# Altium schematic symbol library TI Amplifiers and Linear Special Function Amplifier.SchLib: 708 symbols (part 12 of 34) (continued)
## TAS5508CPAG
designator U?
8 Channel PWM Processor, 0 to 70 degC, 64-pin QFP (PAG64), Green (RoHS & no Sb/Br); Manufacturer: Texas Instruments; PartNumber: TAS5508CPAG; Audio Output Channels (PWM)(#): 8; Bass/Treble Tone Control: TRUE; Data Resolution: 16, 20, 24; Digital Supply (up to 5 V)(Max)(V): 3.6; Digital Supply (up to 5 V)(Min)(V): 3; Dynamic Range(dB): 102; Fs(Max)(kHz): 192; Fs(Min)(kHz): 32; Loudness Compensation: Yes; Serial Interface: I2S, R, L; DatasheetVersion: SLES257; PackageVersion: 4040282/C, 11/1996; PackageReference: PAG64; PackageDescription: 64-Pin Plastic Flat Pack, Body 10 x 10 mm, Pitch 0.50 mm; Supplier 1: Digi-Key; Supplier Part Number 1: 296-32725-ND; Supplier 2: Mouser; Supplier Part Number 2: 595-TAS5508CPAG; Class-D: TRUE; Digital Input: TRUE; Eco-Plan: Green (RoHS & no Sb/Br); Mute: Yes; Output: PWM; PWM Headphone Output: TRUE; SubFamily: PWM Processor; Volume Control: TRUE; Mounting Technology: Surface Mount; Code_JEDEC: MS-026; ComponentLink1Description: Manufacturer URL; ComponentLink1URL: http://www.ti.com/; ComponentLink2Description: Datasheet; ComponentLink2URL: http://www.ti.com/general/docs/lit/getliterature.tsp?genericPartNumber=TAS5508C&fileType=pdf; ComponentLink3Description: Package Specification; ComponentLink3URL: http://www.ti.com/lit/ml/mtqf006a/mtqf006a.pdf
footprint TI-PAG64_N (QFP, 64-Leads, Body 10x10mm, Pitch 0.5mm, IPC Medium Density)
footprint TI-PAG64_L (QFP, 64-Leads, Body 10x10mm, Pitch 0.5mm, IPC High Density)
footprint TI-PAG64_M (QFP, 64-Leads, Body 10x10mm, Pitch 0.5mm, IPC Low Density)
part A pins: 2 PLL_FLT_RET (in) "PLL external filter return", 3 PLL_FLTM "PLL negative input. Connected to PLL_FLT_RTN via an RC network", 4 PLL_FLTP "PLL positive input. Connected to PLL_FLT_RTN via an RC network", 10 VBGAP (out) "Band-gap voltage reference. A pinout of the internally regulated 1.2-V reference.Typically has a 1-nF low-ESR capacitor between VBGAP and AVSS_PLL. This terminal must not be used to power external devices.", 11 ~{RESET} (in) "System reset input, active-low. A system reset is generated by applying a logic low to this terminal. R\E\S\E\T\ is an asynchronous control signal that restores the TAS5508C to its default conditions, sets the valid output (See Datasheet)", 12 ~{HP_SEL} (in) "Headphone in/out selector. When a logic low is applied, the headphone is selected (speakers are off). When a logic high is applied, speakers are selected(headphone is off).", 13 ~{PDN} (in) "Power down, active-low. P\D\N\ powers down all logic and stops all clocks whenever a logic low is applied. The internal parameters are preserved through a power-down cycle, as long as R\E\S\E\T\ is not active. The duration (See Datasheet)", 14 ~{MUTE} (in) "Soft mute of outputs, active-low (muted signal = a logic low, normal operation =a logic high). The mute control provides a noiseless volume ramp to silence.Releasing mute provides a noiseless ramp to previous volume.", 18 OSC_CAP "Oscillator capacitor", 19 XTL_OUT "XTL_OUT and XTL_IN are the only LVCMOS terminals on the device. They provide a reference clock for the TAS5508C via use of an external fundamental-mode crystal. XTL_OUT is the 1.8-V output drive to the crystal. A 13.5-MHz (See Datasheet)", 20 XTL_IN "XTL_OUT and XTL_IN are the only LVCMOS terminals on the device. They provide a reference clock for the TAS5508C via use of an external fundamental-mode crystal. XTL_IN  is the 1.8-V output drive to the crystal. A 13.5-MHz (See Datasheet)", 21 RESERVED (power) "Connect to digital ground", 22 RESERVED (power) "Connect to digital ground", 23 RESERVED (power) "Connect to digital ground", 24 SDA (io) "I2C serial-control data-interface input/output", 25 SCL (io) "I2C serial-control clock input/output", 26 LRCLK (in) "Serial-audio data left/right clock (sampling-rate clock)", 27 SCLK (in) "Serial-audio data clock (shift clock) input", 28 SDIN4 (in) "Serial-audio data input 4 is one of the serial-data input ports. SDIN4 supports four discrete (stereo) data formats and is capable of inputting data at 64 Fs.", 29 SDIN3 (in) "Serial-audio data input 3 is one of the serial-data input ports. SDIN4 supports four discrete (stereo) data formats and is capable of inputting data at 64 Fs.", 30 SDIN2 (in) "Serial-audio data input 2 is one of the serial-data input ports. SDIN2 supports four discrete (stereo) data formats and is capable of inputting data at 64 Fs.", 31 SDIN1 (in) "Serial-audio data input 1 is one of the serial-data input ports. SDIN2 supports four discrete (stereo) data formats and is capable of inputting data at 64 Fs.", 32 PSVC (hiz) "Power-supply volume control PWM output", 37 ~{BKND_ERR} (in) "Active-low. A back-end error sequence is generated by applying logic low to this terminal. The B\K\N\D\_\E\R\R\ results in no change to any system parameters, with all H-bridge drive signals going to a hard-mute (M) state.", 39 VALID (out) "Output indicating validity of PWM outputs, active-high", 40 PWM_M_1 (out) "PWM 1 output (differential -)", 41 PWM_P_1 (out) "PWM 1 output (differential +)", 42 PWM_M_2 (out) "PWM 2 output (differential -)", 43 PWM_P_2 (out) "PWM 2 output (differential +)", 44 PWM_M_3 (out) "PWM 3 output (differential -)", 45 PWM_P_3 (out) "PWM 3 output (differential +)", 46 PWM_M_4 (out) "PWM 4 output (differential -)", 47 PWM_P_4 (out) "PWM 4 output (differential +)", 49 PWM_M_7 (out) "PWM 7 (lineout L) output (differential -)", 50 PWM_P_7 (out) "PWM 7 (lineout L) output (differential +)", 51 PWM_M_8 (out) "PWM 8 (lineout R) output (differential -)", 52 PWM_P_8 (out) "PWM 8 (lineout R) output (differential +)", 55 PWM_M_5 (out) "PWM 5 output (differential -)", 56 PWM_P_5 (out) "PWM 5 output (differential +)", 57 PWM_M_6 (out) "PWM 6 output (differential -)", 58 PWM_P_6 (out) "PWM 6 output (differential +)", 59 PWM_HPML (out) "PWM left-channel headphone (differential -)", 60 PWM_HPPL (out) "PWM left-channel headphone (differential +)", 61 PWM_HPMR (out) "PWM right-channel headphone (differential -)", 62 PWM_HPPR (out) "PWM right-channel headphone (differential +)", 63 MCLK (in) "MCLK is a 3.3-V master clock input. The input frequency of this clock can range from 4 MHz to 50 MHz.", 64 RESERVED (power) "Connect to digital ground"
part B pins: 1 VRA_PLL (power) "Voltage reference for 1.8-V PLL analog supply. A pinout of the internally regulated 1.8-V power used by PLL logic. A 0.1-uF low-ESR capacitor should be connected between this terminal and AVSS_PLL. This terminal must not be (See Datasheet)", 5 AVSS (power) "Analog ground", 6 AVSS (power) "Analog ground", 7 VRD_PLL (power) "Voltage reference for 1.8-V PLL digital supply. A pinout of the internally regulated 1.8-V power used by PLL logic. A 0.1-uF low-ESR capacitor should be connected between this terminal and AVSS_PLL. This terminal must not be (See Datasheet)", 8 AVSS_PLL (power) "Analog ground for PLL. This terminal should reference the same ground as terminal DVSS, but to achieve low PLL jitter, ground noise at this terminal must be minimized. The availability of the AVSS terminal allows a designer (See Datasheet)", 9 AVDD_PLL (power) "3.3-V analog power supply for PLL. This terminal can be connected to the same power source used to drive power terminal DVDD, but to achieve low PLL jitter, this terminal should be bypassed to AVSS_PLL with a 0.1-uF low-ESR (See Datasheet)", 15 DVDD (power) "3.3-V digital power supply", 16 DVSS (power) "Digital ground", 17 VR_DPLL (power) "Voltage reference for 1.8-V digital PLL supply. A pinout of the internally regulated 1.8-V power used by digital PLL logic. A 0.1-uF low-ESR capacitor should be connected between this terminal and DVSS_CORE. This terminal (See Datasheet)", 33 VR_DIG (power) "Voltage reference for 1.8-V digital core supply. A pinout of the internally regulated 1.8-V power used by digital core logic. A 4.7-uF low-ESR capacitor should be connected between this terminal and DVSS. This terminal must (See Datasheet)", 34 DVSS (power) "Digital ground", 35 DVSS (power) "Digital ground", 36 DVDD (power) "3.3-V digital power supply", 38 DVSS (power) "Digital ground", 48 VR_PWM (power) "Voltage reference for 1.8-V digital PWM core supply. A pinout of the internally regulated 1.8-V power used by digital PWM core logic. A 0.1-uF low-ESR capacitor should be connected between this terminal and DVSS_PWM. This (See Datasheet)", 53 DVSS_PWM (power) "Digital ground for PWM", 54 DVDD_PWM (power) "3.3-V digital power supply for PWM"

## TAS5508CPAGR
designator U?
8 Channel PWM Processor, 0 to 70 degC, 64-pin QFP (PAG64), Green (RoHS & no Sb/Br); Manufacturer: Texas Instruments; PartNumber: TAS5508CPAGR; Audio Output Channels (PWM)(#): 8; Bass/Treble Tone Control: TRUE; Data Resolution: 16, 20, 24; Digital Supply (up to 5 V)(Max)(V): 3.6; Digital Supply (up to 5 V)(Min)(V): 3; Dynamic Range(dB): 102; Fs(Max)(kHz): 192; Fs(Min)(kHz): 32; Loudness Compensation: Yes; Serial Interface: I2S, R, L; DatasheetVersion: SLES257; PackageVersion: 4040282/C, 11/1996; PackageReference: PAG64; PackageDescription: 64-Pin Plastic Flat Pack, Body 10 x 10 mm, Pitch 0.50 mm; Supplier 1: Digi-Key; Supplier Part Number 1: 296-27840-2-ND; Supplier 2: Digi-Key; Supplier Part Number 2: 296-27840-1-ND; Supplier 3: Digi-Key; Supplier Part Number 3: 296-27840-6-ND; Supplier 4: Farnell; Supplier Part Number 4: 1863109; Supplier 5: Newark; Supplier Part Number 5: 39T5717; Supplier 6: Newark; Supplier Part Number 6: 91R2089; Supplier 7: Mouser; Supplier Part Number 7: 595-TAS5508CPAGR; Class-D: TRUE; Digital Input: TRUE; Eco-Plan: Green (RoHS & no Sb/Br); Mute: Yes; Output: PWM; PWM Headphone Output: TRUE; SubFamily: PWM Processor; Volume Control: TRUE; Mounting Technology: Surface Mount; Code_JEDEC: MS-026; ComponentLink1Description: Manufacturer URL; ComponentLink1URL: http://www.ti.com/; ComponentLink2Description: Datasheet; ComponentLink2URL: http://www.ti.com/general/docs/lit/getliterature.tsp?genericPartNumber=TAS5508C&fileType=pdf; ComponentLink3Description: Package Specification; ComponentLink3URL: http://www.ti.com/lit/ml/mtqf006a/mtqf006a.pdf
footprint TI-PAG64_N (QFP, 64-Leads, Body 10x10mm, Pitch 0.5mm, IPC Medium Density)
footprint TI-PAG64_L (QFP, 64-Leads, Body 10x10mm, Pitch 0.5mm, IPC High Density)
footprint TI-PAG64_M (QFP, 64-Leads, Body 10x10mm, Pitch 0.5mm, IPC Low Density)
part A pins: 2 PLL_FLT_RET (in) "PLL external filter return", 3 PLL_FLTM "PLL negative input. Connected to PLL_FLT_RTN via an RC network", 4 PLL_FLTP "PLL positive input. Connected to PLL_FLT_RTN via an RC network", 10 VBGAP (out) "Band-gap voltage reference. A pinout of the internally regulated 1.2-V reference.Typically has a 1-nF low-ESR capacitor between VBGAP and AVSS_PLL. This terminal must not be used to power external devices.", 11 ~{RESET} (in) "System reset input, active-low. A system reset is generated by applying a logic low to this terminal. R\E\S\E\T\ is an asynchronous control signal that restores the TAS5508C to its default conditions, sets the valid output (See Datasheet)", 12 ~{HP_SEL} (in) "Headphone in/out selector. When a logic low is applied, the headphone is selected (speakers are off). When a logic high is applied, speakers are selected(headphone is off).", 13 ~{PDN} (in) "Power down, active-low. P\D\N\ powers down all logic and stops all clocks whenever a logic low is applied. The internal parameters are preserved through a power-down cycle, as long as R\E\S\E\T\ is not active. The duration (See Datasheet)", 14 ~{MUTE} (in) "Soft mute of outputs, active-low (muted signal = a logic low, normal operation =a logic high). The mute control provides a noiseless volume ramp to silence.Releasing mute provides a noiseless ramp to previous volume.", 18 OSC_CAP "Oscillator capacitor", 19 XTL_OUT "XTL_OUT and XTL_IN are the only LVCMOS terminals on the device. They provide a reference clock for the TAS5508C via use of an external fundamental-mode crystal. XTL_OUT is the 1.8-V output drive to the crystal. A 13.5-MHz (See Datasheet)", 20 XTL_IN "XTL_OUT and XTL_IN are the only LVCMOS terminals on the device. They provide a reference clock for the TAS5508C via use of an external fundamental-mode crystal. XTL_IN  is the 1.8-V output drive to the crystal. A 13.5-MHz (See Datasheet)", 21 RESERVED (power) "Connect to digital ground", 22 RESERVED (power) "Connect to digital ground", 23 RESERVED (power) "Connect to digital ground", 24 SDA (io) "I2C serial-control data-interface input/output", 25 SCL (io) "I2C serial-control clock input/output", 26 LRCLK (in) "Serial-audio data left/right clock (sampling-rate clock)", 27 SCLK (in) "Serial-audio data clock (shift clock) input", 28 SDIN4 (in) "Serial-audio data input 4 is one of the serial-data input ports. SDIN4 supports four discrete (stereo) data formats and is capable of inputting data at 64 Fs.", 29 SDIN3 (in) "Serial-audio data input 3 is one of the serial-data input ports. SDIN4 supports four discrete (stereo) data formats and is capable of inputting data at 64 Fs.", 30 SDIN2 (in) "Serial-audio data input 2 is one of the serial-data input ports. SDIN2 supports four discrete (stereo) data formats and is capable of inputting data at 64 Fs.", 31 SDIN1 (in) "Serial-audio data input 1 is one of the serial-data input ports. SDIN2 supports four discrete (stereo) data formats and is capable of inputting data at 64 Fs.", 32 PSVC (hiz) "Power-supply volume control PWM output", 37 ~{BKND_ERR} (in) "Active-low. A back-end error sequence is generated by applying logic low to this terminal. The B\K\N\D\_\E\R\R\ results in no change to any system parameters, with all H-bridge drive signals going to a hard-mute (M) state.", 39 VALID (out) "Output indicating validity of PWM outputs, active-high", 40 PWM_M_1 (out) "PWM 1 output (differential -)", 41 PWM_P_1 (out) "PWM 1 output (differential +)", 42 PWM_M_2 (out) "PWM 2 output (differential -)", 43 PWM_P_2 (out) "PWM 2 output (differential +)", 44 PWM_M_3 (out) "PWM 3 output (differential -)", 45 PWM_P_3 (out) "PWM 3 output (differential +)", 46 PWM_M_4 (out) "PWM 4 output (differential -)", 47 PWM_P_4 (out) "PWM 4 output (differential +)", 49 PWM_M_7 (out) "PWM 7 (lineout L) output (differential -)", 50 PWM_P_7 (out) "PWM 7 (lineout L) output (differential +)", 51 PWM_M_8 (out) "PWM 8 (lineout R) output (differential -)", 52 PWM_P_8 (out) "PWM 8 (lineout R) output (differential +)", 55 PWM_M_5 (out) "PWM 5 output (differential -)", 56 PWM_P_5 (out) "PWM 5 output (differential +)", 57 PWM_M_6 (out) "PWM 6 output (differential -)", 58 PWM_P_6 (out) "PWM 6 output (differential +)", 59 PWM_HPML (out) "PWM left-channel headphone (differential -)", 60 PWM_HPPL (out) "PWM left-channel headphone (differential +)", 61 PWM_HPMR (out) "PWM right-channel headphone (differential -)", 62 PWM_HPPR (out) "PWM right-channel headphone (differential +)", 63 MCLK (in) "MCLK is a 3.3-V master clock input. The input frequency of this clock can range from 4 MHz to 50 MHz.", 64 RESERVED (power) "Connect to digital ground"
part B pins: 1 VRA_PLL (power) "Voltage reference for 1.8-V PLL analog supply. A pinout of the internally regulated 1.8-V power used by PLL logic. A 0.1-uF low-ESR capacitor should be connected between this terminal and AVSS_PLL. This terminal must not be (See Datasheet)", 5 AVSS (power) "Analog ground", 6 AVSS (power) "Analog ground", 7 VRD_PLL (power) "Voltage reference for 1.8-V PLL digital supply. A pinout of the internally regulated 1.8-V power used by PLL logic. A 0.1-uF low-ESR capacitor should be connected between this terminal and AVSS_PLL. This terminal must not be (See Datasheet)", 8 AVSS_PLL (power) "Analog ground for PLL. This terminal should reference the same ground as terminal DVSS, but to achieve low PLL jitter, ground noise at this terminal must be minimized. The availability of the AVSS terminal allows a designer (See Datasheet)", 9 AVDD_PLL (power) "3.3-V analog power supply for PLL. This terminal can be connected to the same power source used to drive power terminal DVDD, but to achieve low PLL jitter, this terminal should be bypassed to AVSS_PLL with a 0.1-uF low-ESR (See Datasheet)", 15 DVDD (power) "3.3-V digital power supply", 16 DVSS (power) "Digital ground", 17 VR_DPLL (power) "Voltage reference for 1.8-V digital PLL supply. A pinout of the internally regulated 1.8-V power used by digital PLL logic. A 0.1-uF low-ESR capacitor should be connected between this terminal and DVSS_CORE. This terminal (See Datasheet)", 33 VR_DIG (power) "Voltage reference for 1.8-V digital core supply. A pinout of the internally regulated 1.8-V power used by digital core logic. A 4.7-uF low-ESR capacitor should be connected between this terminal and DVSS. This terminal must (See Datasheet)", 34 DVSS (power) "Digital ground", 35 DVSS (power) "Digital ground", 36 DVDD (power) "3.3-V digital power supply", 38 DVSS (power) "Digital ground", 48 VR_PWM (power) "Voltage reference for 1.8-V digital PWM core supply. A pinout of the internally regulated 1.8-V power used by digital PWM core logic. A 0.1-uF low-ESR capacitor should be connected between this terminal and DVSS_PWM. This (See Datasheet)", 53 DVSS_PWM (power) "Digital ground for PWM", 54 DVDD_PWM (power) "3.3-V digital power supply for PWM"

## TAS5601DCA
designator U?
20 W Stereo Digital Amplifier Power Stage with Feedback, -40 to 85 degC, 56-pin SOP (DCA56), Green (RoHS & no Sb/Br); Manufacturer: Texas Instruments; PartNumber: TAS5601DCA; Analog Supply Max [V]: 26; Analog Supply Min [V]: 10; Input Type: PWM; Max. Number of Speaker Outputs: 4; SubFamily: Mid/High-Power Amplifier; DatasheetVersion: SLAS585A; PackageVersion: 4073259-3/E, 07/2011; PackageReference: DCA56-5825X3235TP; PackageDescription: 56-Pin Plastic Small Outline, Body 14 x 6.1 mm, Pitch 0.5 mm; Supplier 1: Digi-Key; Supplier Part Number 1: TAS5601DCA-ND; Supplier 2: Farnell; Supplier Part Number 2: 1755215; Supplier 3: Mouser; Supplier Part Number 3: 595-TAS5601DCA; Eco-Plan: Green (RoHS & no Sb/Br); Mounting Technology: Surface Mount; Code_JEDEC: MO-153; ComponentLink1Description: Manufacturer URL; ComponentLink1URL: http://www.ti.com/; ComponentLink2Description: Datasheet; ComponentLink2URL: http://www.ti.com/general/docs/lit/getliterature.tsp?genericPartNumber=TAS5601&fileType=pdf; ComponentLink3Description: Package Specification; ComponentLink3URL: http://www.ti.com/lit/ds/symlink/tas5182.pdf
footprint TI-DCA56-5825X3235TP_N (SOP, 56-Leads, Body 14.1x6.2mm, Pitch 0.5mm, Thermal Pad 6.35x3.61mm, IPC Medium Density)
footprint TI-DCA56-5825X3235TP_L (SOP, 56-Leads, Body 14.1x6.2mm, Pitch 0.5mm, Thermal Pad 6.35x3.61mm, IPC High Density)
footprint TI-DCA56-5825X3235TP_M (SOP, 56-Leads, Body 14.1x6.2mm, Pitch 0.5mm, Thermal Pad 6.35x3.61mm, IPC Low Density)
part A pins: 10 PWM_AP (in) "Positive audio signal PWM input for channel A (Must be the complement of PWM_AN)", 11 PWM_AN (in) "Negative audio signal PWM input for channel A (Must be the complement of PWM_AP)", 12 PWM_BP (in) "Positive audio signal PWM input for channel B (Must be the complement of PWM_BN)", 13 PWM_BN (in) "Negative audio signal PWM input for channel B (Must be the complement of PWM_BP)", 14 PWM_CP (in) "Positive audio signal PWM input for channel C (Must be the complement of PWM_CN)", 15 PWM_CN (in) "Negative audio signal PWM input for channel C (Must be the complement of PWM_CP)", 16 PWM_DP (in) "Positive audio signal PWM input for channel D (Must be the complement of PWM_DN)", 17 PWM_DN (in) "Negative audio signal PWM input for channel D (Must be the complement of PWM_DP)", 18 ~{RESET} (in) "Enable/Disable pin R\E\S\E\T\ = High, normal operation R\E\S\E\T\ = Low, held in reset mode", 19 ~{FAULT} (out) "Short circuit fault F\A\U\L\T\ = High, normal operation F\A\U\L\T\ = Low, short circuit at output detected. F\A\U\L\T\ will latch if short circuit detected and will be reset if the R\E\S\E\T\ pin is pulled low or the VCC (See Datasheet)", 20 SE/~{BTL} (in) "Single-ended or Bridge-tied output select terminal. If any output is configured as a single-ended load, this pin should be connected to DVDD. For 2-channel, BTL operation, connect to GND.", 21 ~{THERM_WARN} (out) "Thermal warning output flag. T\H\E\R\M\_\W\A\R\N\ = HIGH, normal operation. T\H\E\R\M\_\W\A\R\N\ = LOW, die temperature has reached 125 deg. C. Automatically resets when temperature falls back to normal range. TTL compatible (See Datasheet)", 29 OUTD (out) "Channel D 1/2 H-bridge output", 30 OUTD (out) "Channel D 1/2 H-bridge output", 34 OUTC (out) "Channel C 1/2 H-bridge output", 35 OUTC (out) "Channel C 1/2 H-bridge output", 38 BSC "Bootstrap I/O for channel C high-side FET", 39 VCLAMP_CD "Internally generated voltage supply for channel C and D bootstrap. Not to be used as a supply or connected to any component other than the decoupling capacitor.", 40 BSD "Bootstrap I/O for channel D high-side FET", 41 BYPASS "VCC/8 reference for analog cells", 45 BSA "Bootstrap I/O for channel A high-side FET", 46 VCLAMP_AB "Internally generated voltage supply for channel A and B bootstrap. Not to be used as a supply or connected to any component other than the decoupling capacitor.", 47 BSB "Bootstrap I/O for channel B high-side FET", 50 OUTB (out) "Channel B 1/2 H-bridge output", 51 OUTB (out) "Channel B 1/2 H-bridge output", 55 OUTA (out) "Channel A 1/2 H-bridge output", 56 OUTA (out) "Channel A 1/2 H-bridge output"
part B pins: 1 PGNDA (power) "Power ground reference for channel A output", 2 PGNDA (power) "Power ground reference for channel A output", 3 PGNDA (power) "Power ground reference for channel A output", 4 PVCCA (power) "Positive power supply for channel A output", 5 PVCCA (power) "Positive power supply for channel A output", 6 PVCCA (power) "Positive power supply for channel A output", 8 DVDD (power) "Digital supply (3V-4.2V). Supply for PWM input signal conditioning, F\A\U\L\T\ and R\S\T\ I/O buffers", 9 DGND (power) "Ground reference input for PWM and digital inputs", 23 PVCCD (power) "Positive power supply for channel D output", 24 PVCCD (power) "Positive power supply for channel D output", 25 PVCCD (power) "Positive power supply for channel D output", 26 PGNDD (power) "Power ground reference for channel D output", 27 PGNDD (power) "Power ground reference for channel D output", 28 PGNDD (power) "Power ground reference for channel D output", 31 PGNDC (power) "Power ground reference for channel C output", 32 PGNDC (power) "Power ground reference for channel C output", 33 PGNDC (power) "Power ground reference for channel C output", 36 PVCCC (power) "Positive power supply for channel C output", 37 PVCCC (power) "Positive power supply for channel C output", 42 AGND (power) "Analog ground", 43 AVCC (power) "Analog power supply", 48 PVCCB (power) "Positive power supply for channel B output", 49 PVCCB (power) "Positive power supply for channel B output", 52 PGNDB (power) "Power ground reference for channel B output", 53 PGNDB (power) "Power ground reference for channel B output", 54 PGNDB (power) "Power ground reference for channel B output", 57 EP (power) "Connect to PGNDx"
part C pins: 7 NC, 22 NC, 44 NC

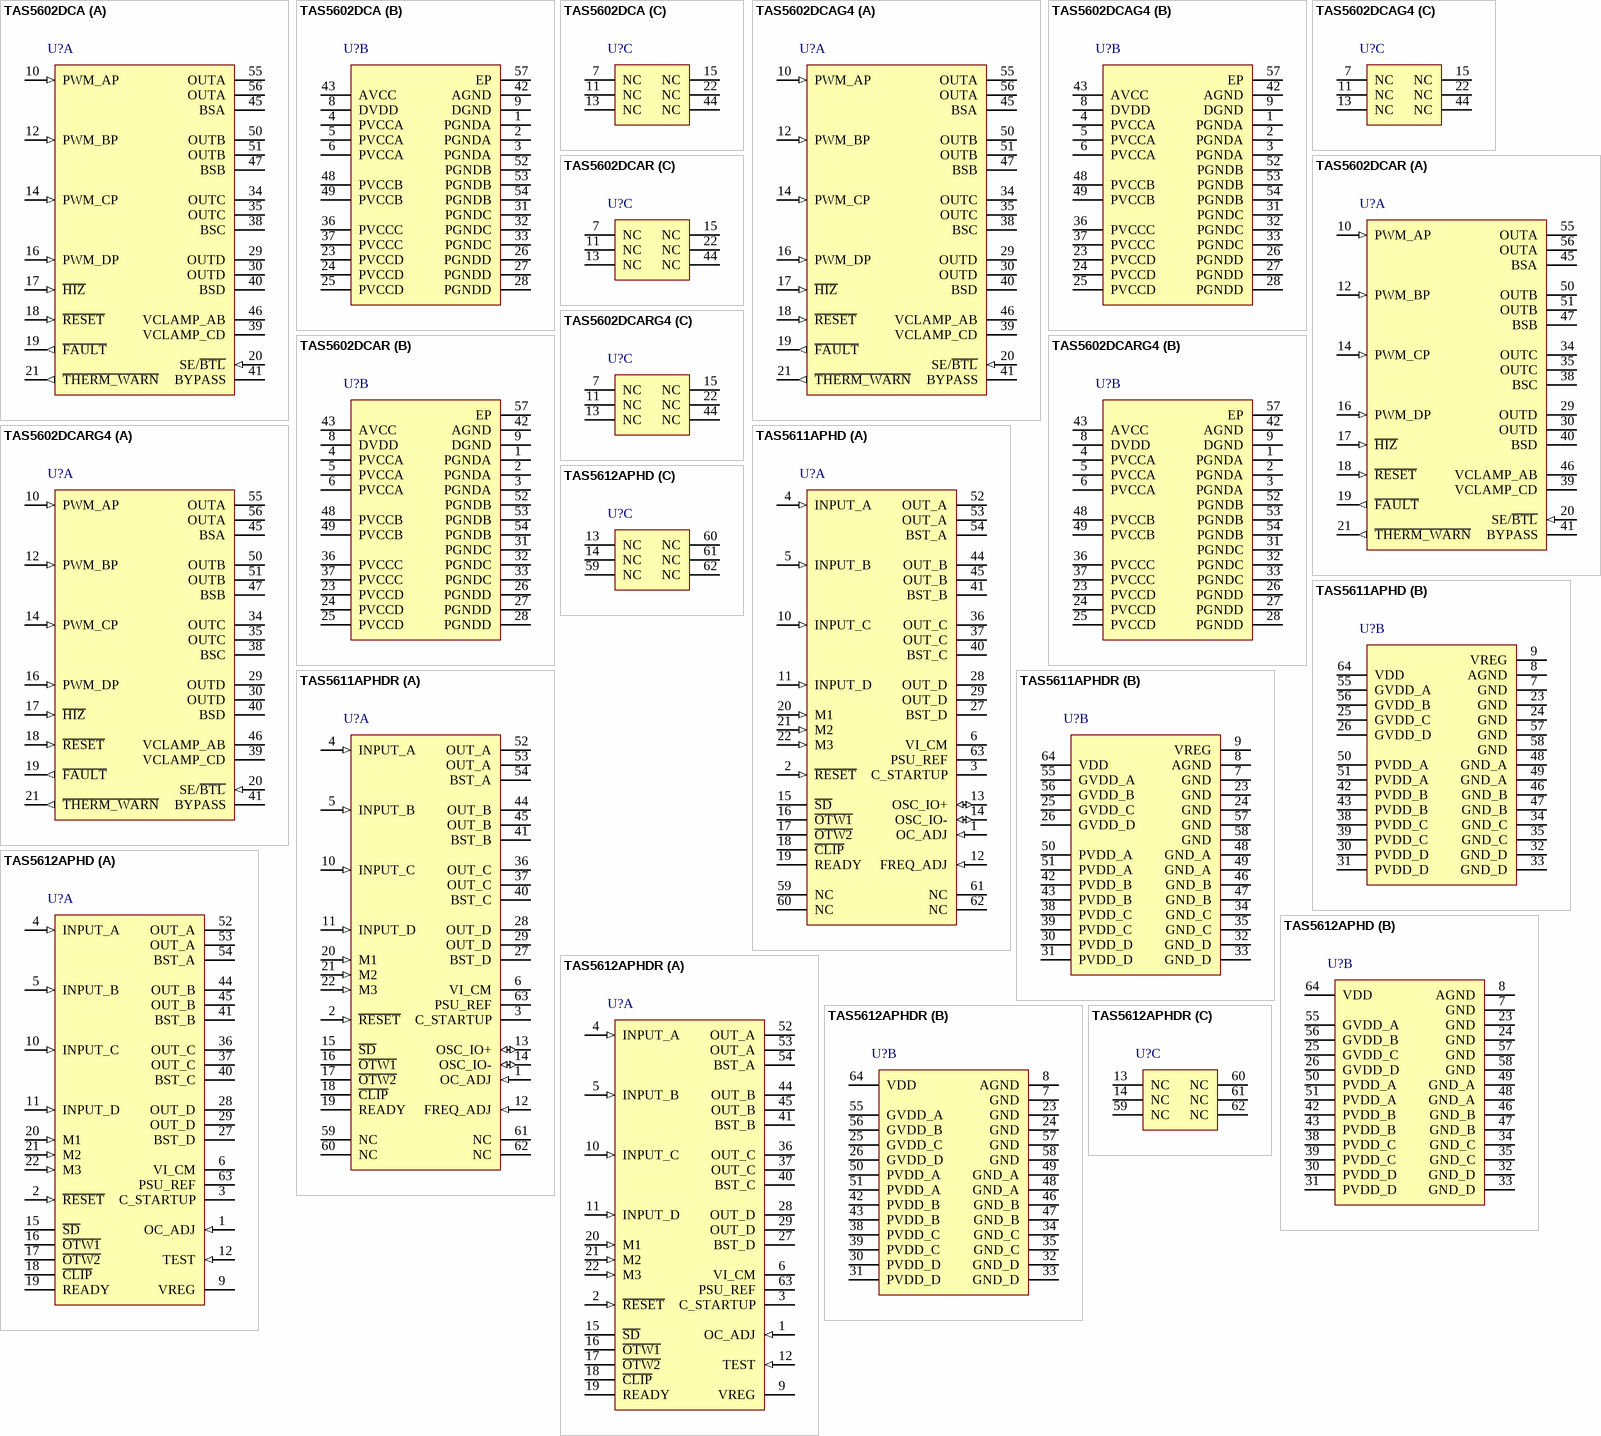
[diagram p16: symbols TAS5602DCA to TAS5612APHDR]

## TAS5602DCA
designator U?
20 W Stereo Digital Amplifier Power Stage with Feedback, -40 to 85 degC, 56-pin SOP (DCA56), Green (RoHS & no Sb/Br); Manufacturer: Texas Instruments; PartNumber: TAS5602DCA; Analog Supply Max [V]: 26; Analog Supply Min [V]: 10; Digital Supply Min [V]: 3; Input Type: PWM; Max. Number of Speaker Outputs: 4; SubFamily: Mid/High-Power Amplifier; DatasheetVersion: SLAS593B; PackageVersion: 4073259-3/E, 07/2011; PackageReference: DCA56-5825X3235TP; PackageDescription: 56-Pin Plastic Small Outline, Body 14 x 6.1 mm, Pitch 0.5 mm; Supplier 1: Digi-Key; Supplier Part Number 1: TAS5602DCA-ND; Supplier 2: Mouser; Supplier Part Number 2: 595-TAS5602DCA; Eco-Plan: Green (RoHS & no Sb/Br); Power Stage Supply Min(V): 10; Mounting Technology: Surface Mount; Code_JEDEC: MO-153; ComponentLink1Description: Manufacturer URL; ComponentLink1URL: http://www.ti.com/; ComponentLink2Description: Datasheet; ComponentLink2URL: http://www.ti.com/general/docs/lit/getliterature.tsp?genericPartNumber=TAS5602&fileType=pdf; ComponentLink3Description: Package Specification; ComponentLink3URL: http://www.ti.com/lit/ds/symlink/tas5182.pdf
footprint TI-DCA56-5825X3235TP_N (SOP, 56-Leads, Body 14.1x6.2mm, Pitch 0.5mm, Thermal Pad 6.35x3.61mm, IPC Medium Density)
footprint TI-DCA56-5825X3235TP_L (SOP, 56-Leads, Body 14.1x6.2mm, Pitch 0.5mm, Thermal Pad 6.35x3.61mm, IPC High Density)
footprint TI-DCA56-5825X3235TP_M (SOP, 56-Leads, Body 14.1x6.2mm, Pitch 0.5mm, Thermal Pad 6.35x3.61mm, IPC Low Density)
part A pins: 10 PWM_AP (in) "Positive audio signal PWM input for channel A", 12 PWM_BP (in) "Positive audio signal PWM input for channel B", 14 PWM_CP (in) "Positive audio signal PWM input for channel C", 16 PWM_DP (in) "Positive audio signal PWM input for channel D", 17 ~{HIZ} (in) "Forces the output to high impedance state. Use this terminal to quickly (<1 ms) disable the output switching in cases like power fail. If H\I\Z\ is tied to R\E\S\E\T\, the volume ramps up slowly at start-up, but the output (See Datasheet)", 18 ~{RESET} (in) "Enable/Disable pin R\E\S\E\T\ = High, normal operation R\E\S\E\T\ = Low, held in reset mode", 19 ~{FAULT} (out) "Short circuit fault F\A\U\L\T\ = High, normal operation F\A\U\L\T\ = Low, short circuit at output detected. F\A\U\L\T\ will latch if short circuit detected and will be reset if the R\E\S\E\T\ pin is pulled low or the VCC (See Datasheet)", 20 SE/~{BTL} (in) "Single-ended or Bridge-tied output select terminal. If any output is configured as a single-ended load, this pin should be connected to DVDD. For 2-channel, BTL operation, connect to GND.", 21 ~{THERM_WARN} (out) "Thermal warning output flag. T\H\E\R\M\_\W\A\R\N\ = HIGH, normal operation. T\H\E\R\M\_\W\A\R\N\ = LOW, die temperature has reached 125 deg. C. Automatically resets when temperature falls back to normal range. TTL compatible (See Datasheet)", 29 OUTD (hiz) "Channel D 1/2 H-bridge output", 30 OUTD (hiz) "Channel D 1/2 H-bridge output", 34 OUTC (hiz) "Channel C 1/2 H-bridge output", 35 OUTC (hiz) "Channel C 1/2 H-bridge output", 38 BSC "Bootstrap I/O for channel C high-side FET", 39 VCLAMP_CD "Internally generated voltage supply for channel C and D bootstrap. Not to be used as a supply or connected to any component other than the decoupling capacitor.", 40 BSD "Bootstrap I/O for channel D high-side FET", 41 BYPASS "VCC/8 reference for analog cells", 45 BSA "Bootstrap I/O for channel A high-side FET", 46 VCLAMP_AB "Internally generated voltage supply for channel A and B bootstrap. Not to be used as a supply or connected to any component other than the decoupling capacitor.", 47 BSB "Bootstrap I/O for channel B high-side FET", 50 OUTB (hiz) "Channel B 1/2 H-bridge output", 51 OUTB (hiz) "Channel B 1/2 H-bridge output", 55 OUTA (hiz) "Channel A 1/2 H-bridge output", 56 OUTA (hiz) "Channel A 1/2 H-bridge output"
part B pins: 1 PGNDA (power) "Power ground reference for channel A output", 2 PGNDA (power) "Power ground reference for channel A output", 3 PGNDA (power) "Power ground reference for channel A output", 4 PVCCA (power) "Positive power supply for channel A output", 5 PVCCA (power) "Positive power supply for channel A output", 6 PVCCA (power) "Positive power supply for channel A output", 8 DVDD (power) "Digital supply (3V-4.2V). Supply for PWM input signal conditioning, F\A\U\L\T\ and R\S\T\ I/O buffers", 9 DGND (power) "Ground reference input for PWM and digital inputs", 23 PVCCD (power) "Positive power supply for channel D output", 24 PVCCD (power) "Positive power supply for channel D output", 25 PVCCD (power) "Positive power supply for channel D output", 26 PGNDD (power) "Power ground reference for channel D output", 27 PGNDD (power) "Power ground reference for channel D output", 28 PGNDD (power) "Power ground reference for channel D output", 31 PGNDC (power) "Power ground reference for channel C output", 32 PGNDC (power) "Power ground reference for channel C output", 33 PGNDC (power) "Power ground reference for channel C output", 36 PVCCC (power) "Positive power supply for channel C output", 37 PVCCC (power) "Positive power supply for channel C output", 42 AGND (power) "Analog ground", 43 AVCC (power) "Analog power supply", 48 PVCCB (power) "Positive power supply for channel B output", 49 PVCCB (power) "Positive power supply for channel B output", 52 PGNDB (power) "Power ground reference for channel B output", 53 PGNDB (power) "Power ground reference for channel B output", 54 PGNDB (power) "Power ground reference for channel B output", 57 EP (power) "Connect to PGNDx"
part C pins: 7 NC "No internal connection.", 11 NC "No internal connection.", 13 NC "No internal connection.", 15 NC "No internal connection.", 22 NC "No internal connection.", 44 NC "No internal connection."